# Altium footprint library tsl_Pcblib.PcbLib: 219 footprints (part 7 of 14)
Each footprint in its own frame and in the unit in brackets; x right, y up, seen from the top. Pads: shape width x height; smd on the part's side, far side on the other; paste and mask are expansions set on the pad; w line width, h text height; cw(c..) or ccw(c..) is an arc to the next point about the centre after c.
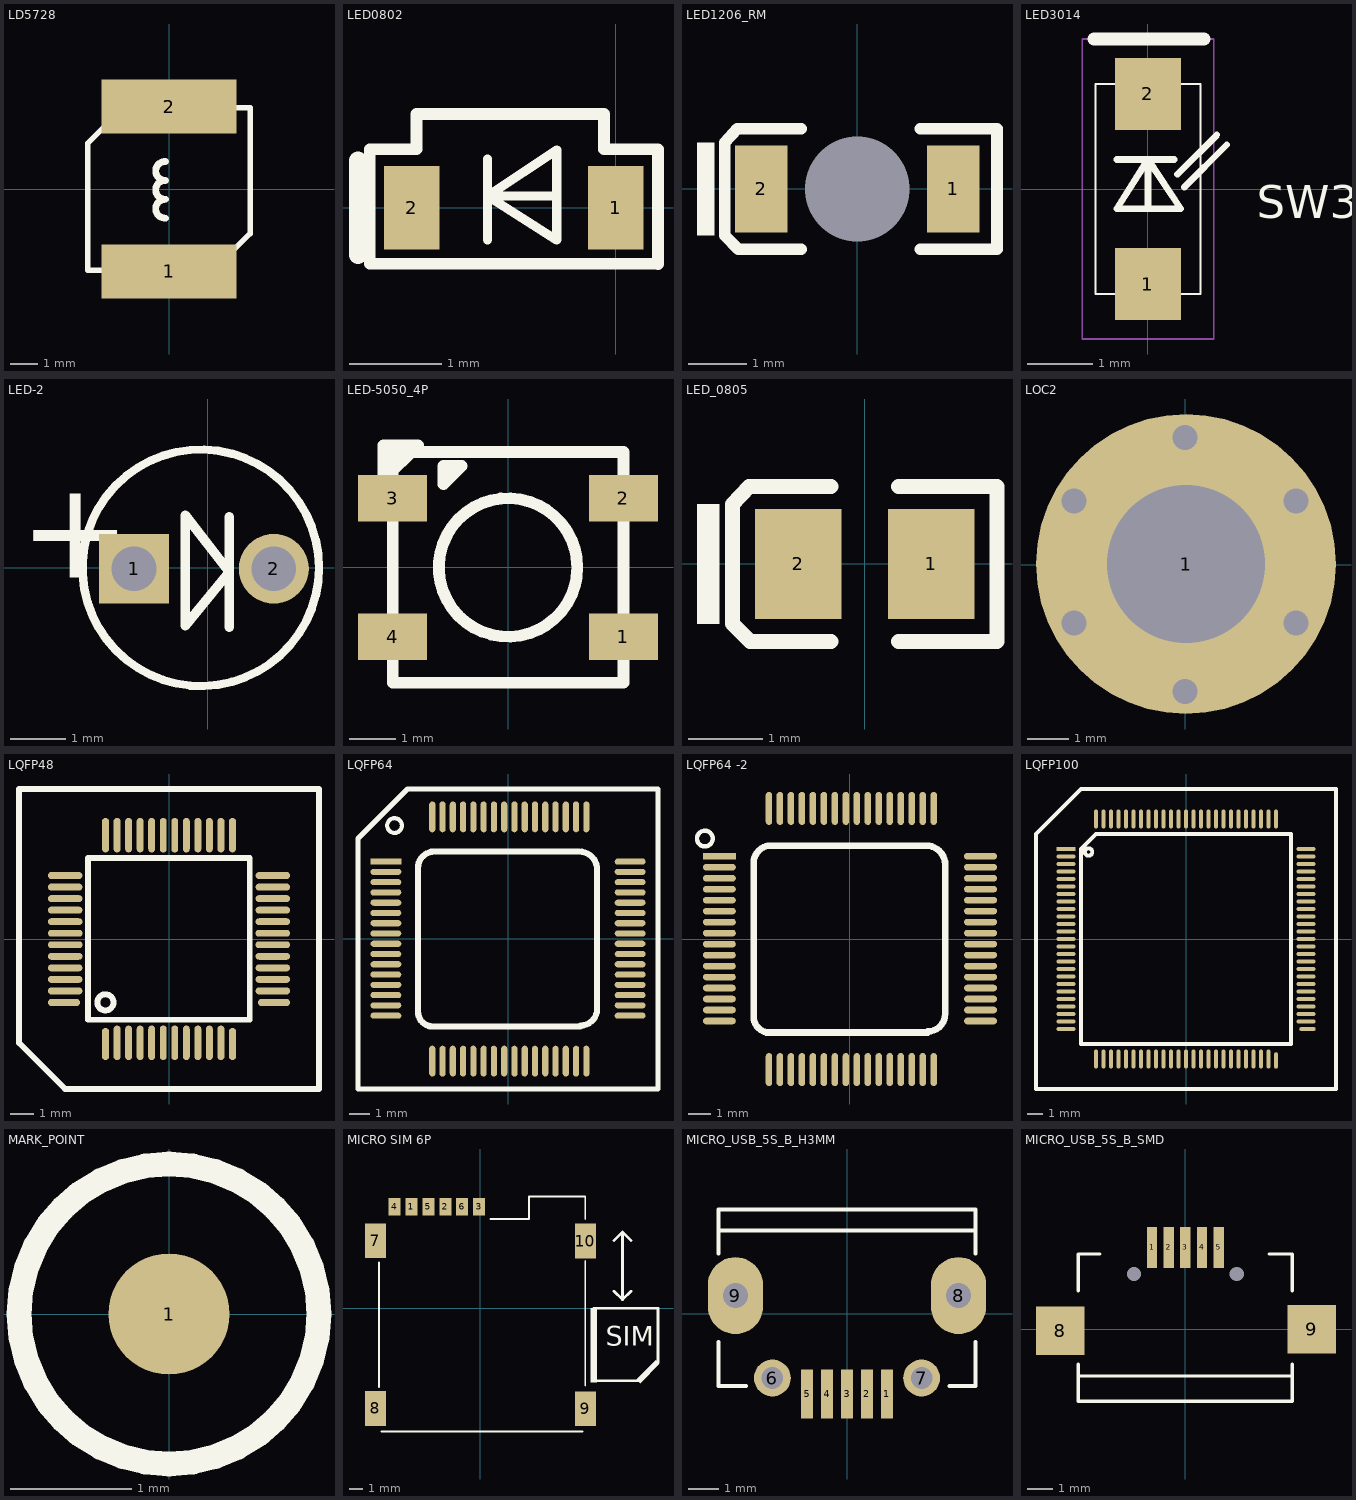
[diagram p6: the footprints below, top view; thin cyan lines are the x and y axes]

## LD5728 [mm]
pads (2):
  rect 5x2 smd: 1(0,-3.048) 2(0,3.048)
Top Overlay:
  lines w0.203: -3,-3 -3,0 -3,1.699 -1.699,3 0,3 3,3 3,0 3,-1.651 1.651,-3 0,-3 -3,-3
  lines w0.254: -0.127,-1.08 cw(c-0.142,-0.731) -0.127,-0.381 cw(c-0.142,-0.031) -0.127,0.318 cw(c-0.142,0.668) -0.127,1.018

## LED0802 [mm]
height 0.6
pads (2):
  rect 0.6x0.9 smd paste-0.05 mask+0.05: 1(0,0) 2(-2.21,0)
Top Overlay:
  lines w0.1: -1.391,-0.348 -1.391,0.527 ; -0.641,0.127 -1.391,0.127 ; -1.391,0.127 -0.641,0.627 -0.641,-0.348 -1.391,0.127
  lines w0.127: 0.457,-0.61 0.457,0.635 -0.127,0.635 -0.127,1.016 -2.159,1.016 -2.159,0.635 -2.667,0.635 -2.667,-0.608 0.457,-0.608
  lines w0.2: -2.794,-0.508 -2.794,0.508

## LED1206_RM [mm]
pads (3):
  rect 0.9x1.5 smd: 1(1.651,0) 2(-1.651,0)
  round 0 hole 1.8 unplated: ""(0,0)
Top Overlay:
  rectangle: -2.753,-0.8 -2.453,0.8
  lines w0.2: -0.958,-1.035 -2.043,-1.035 -2.278,-0.8 -2.278,0.8 -2.058,1.035 -0.958,1.035 ; 1.085,-1.035 2.405,-1.035 2.405,1.035 1.085,1.035

## LED3014 [mm]
pads (2):
  rect 1x1.1 smd paste-0.05 mask+0.05: 1(0,-1.45) 2(0,1.45)
Top Overlay:
  lines w0.025: -0.8,-1.6 -0.8,1.6 0.8,1.6 0.8,-1.6 -0.8,-1.6
  lines w0.1: -0.475,0.45 0.4,0.45 ; 0,-0.3 0,0.45 ; 0.45,0.225 1.05,0.825 ; 0.55,0.025 1.2,0.675 ; 0,0.45 -0.475,-0.3 0.5,-0.3 0,0.45
  lines w0.2: -0.825,2.286 0.85,2.286
  text "SW3" at 1.659,-0.445 h0.5
Mechanical 1:
  lines w0.025: -1,-2.286 1,-2.286 1,2.286 -1,2.286 -1,-2.286

## LED-2 [mil]
pads (2):
  rect 50x50 hole 32: 1(-52.72,-0.72)
  round 50 hole 32: 2(47.28,-0.72)
Top Overlay:
  circle w6: c-5,0 r84.61
  lines w7: 15.37,-42.37 15.37,36.37 ; -16,-41.37 -16,37.37 15.37,-3 -16,-41.37
  text "+" at -135,-30 h120

## LED-5050_4P [mm]
pads (4):
  rect 1.5x1 smd: 1(2.5,-1.5) 2(2.5,1.5) 3(-2.5,1.5) 4(-2.5,-1.5)
Top Overlay:
  circle w0.254: c0.001,0 r1.5
  lines w0.254: -2.699,1.9 -1.949,2.65 -2.699,2.65 -2.699,1.9 ; -2.499,-2.5 -2.499,2.5 2.501,2.5 2.501,-2.5 -2.499,-2.5 ; -1.399,1.8 -0.999,2.2 -1.399,2.2 -1.399,1.8

## LED_0805 [mm]
pads (2):
  rect 1.16x1.47 smd: 1(0.89,0) 2(-0.89,0)
Top Overlay:
  rectangle: -2.245,-0.8 -1.945,0.8
  lines w0.2: -0.45,-1.035 -1.535,-1.035 -1.77,-0.8 -1.77,0.8 -1.55,1.035 -0.45,1.035 ; 0.45,-1.035 1.77,-1.035 1.77,1.035 0.45,1.035
3D body "User Library-led_0805.step": height 1.1, standoff 0, extent -1.01,-0.625 1.01,0.625

## LOC2 [mm]
height 1.35
pads (1):
  round 7.2 hole 3.8: 1(0.021,0.014)
via 0,3.048 diameter 0.8 hole 0.6
via 2.667,-1.397 diameter 0.8 hole 0.6
via 2.667,1.524 diameter 0.8 hole 0.6
via -2.667,1.524 diameter 0.8 hole 0.6
via -2.667,-1.397 diameter 0.8 hole 0.6
via 0,-3.048 diameter 0.8 hole 0.6

## LQFP48 [mm]
pads (48):
  oval 0.3x1.4 smd: 1(-2.75,-4.55) 12(2.75,-4.55)
  oval 0.3x1.5 smd: 2(-2.25,-4.5) 3(-1.75,-4.5) 4(-1.25,-4.5) 5(-0.75,-4.5) 6(-0.25,-4.5) 7(0.25,-4.5) 8(0.75,-4.5) 9(1.25,-4.5) 10(1.75,-4.5) 11(2.25,-4.5) 25(2.75,4.5) 26(2.25,4.5) 27(1.75,4.5) 28(1.25,4.5) 29(0.75,4.5) 30(0.25,4.5) 31(-0.25,4.5) 32(-0.75,4.5) 33(-1.25,4.5) 34(-1.75,4.5) 35(-2.25,4.5) 36(-2.75,4.5)
  oval 1.4x0.3 smd: 13(4.55,-2.75) 48(-4.55,-2.75)
  oval 1.5x0.3 smd: 14(4.5,-2.25) 15(4.5,-1.75) 16(4.5,-1.25) 17(4.5,-0.75) 18(4.5,-0.25) 19(4.5,0.25) 20(4.5,0.75) 21(4.5,1.25) 22(4.5,1.75) 23(4.5,2.25) 24(4.5,2.75) 37(-4.5,2.75) 38(-4.5,2.25) 39(-4.5,1.75) 40(-4.5,1.25) 41(-4.5,0.75) 42(-4.5,0.25) 43(-4.5,-0.25) 44(-4.5,-0.75) 45(-4.5,-1.25) 46(-4.5,-1.75) 47(-4.5,-2.25)
Top Overlay:
  circle w0.254: c-2.753,-2.746 r0.35
  lines w0.254: -6.5,-4.5 -4.5,-6.5 6.5,-6.5 6.5,6.5 -6.5,6.5 -6.5,-4.5 ; -3.503,-3.496 -3.503,3.504 3.497,3.504 3.497,-3.496 -3.503,-3.496
3D body "User Library-LQFP48_Grid_0_5.STEP": height 1.6, standoff 0, extent -4.5,-4.5 4.5,4.5

## LQFP64 [mm] "LQFP64"
pads (64):
  rect 1.5x0.3 smd: 1(-5.945,3.768)
  oval 1.5x0.3 smd: 2(-5.945,3.268) 3(-5.945,2.768) 4(-5.945,2.268) 5(-5.945,1.768) 6(-5.945,1.268) 7(-5.945,0.768) 8(-5.945,0.268) 9(-5.945,-0.232) 10(-5.945,-0.732) 11(-5.945,-1.232) 12(-5.945,-1.732) 13(-5.945,-2.232) 14(-5.945,-2.732) 15(-5.945,-3.232) 16(-5.945,-3.732) 33(5.945,-3.732) 34(5.945,-3.232) 35(5.945,-2.732) 36(5.945,-2.232) 37(5.945,-1.732) 38(5.945,-1.232) 39(5.945,-0.732) 40(5.945,-0.232) 41(5.945,0.268) 42(5.945,0.768) 43(5.945,1.268) 44(5.945,1.768) 45(5.945,2.268) 46(5.945,2.768) 47(5.945,3.268) 48(5.945,3.768)
  oval 0.3x1.5 smd: 17(-3.687,-5.945) 18(-3.186,-5.945) 19(-2.687,-5.945) 20(-2.186,-5.945) 21(-1.687,-5.945) 22(-1.186,-5.945) 23(-0.687,-5.945) 24(-0.186,-5.945) 25(0.313,-5.945) 26(0.814,-5.945) 27(1.313,-5.945) 28(1.814,-5.945) 29(2.313,-5.945) 30(2.814,-5.945) 31(3.313,-5.945) 32(3.814,-5.945) 49(3.814,5.945) 50(3.313,5.945) 51(2.814,5.945) 52(2.313,5.945) 53(1.814,5.945) 54(1.313,5.945) 55(0.814,5.945) 56(0.313,5.945) 57(-0.186,5.945) 58(-0.687,5.945) 59(-1.186,5.945) 60(-1.687,5.945) 61(-2.186,5.945) 62(-2.687,5.945) 63(-3.186,5.945) 64(-3.687,5.945)
Top Overlay:
  circle w0.2: c-5.525,5.524 r0.358
  lines w0.254: -7.303,-7.303 7.302,-7.303 7.302,7.302 -4.89,7.302 -7.303,4.889 -7.303,-7.303
  lines w0.3: -3.811,-4.258 3.536,-4.258 ; -3.741,4.254 3.467,4.254 cw(c3.467,3.384) 4.337,3.384 ; -3.662,-4.258 cw(c-3.662,-3.538) -4.382,-3.538 -4.382,3.464 cw(c-3.592,3.464) -3.592,4.254 ; 3.536,-4.211 ccw(c3.536,-3.411) 4.337,-3.411 4.337,3.511
3D body "User Library-STM32F107 -LQFP64 10mm x 10mm.step": height 1.6, standoff 0.01, extent -5.999,-5.969 5.999,6.029

## LQFP64 -2 [mm] "LQFP64"
pads (64):
  rect 1.5x0.3 smd: 1(-5.945,3.768)
  oval 1.5x0.3 smd: 2(-5.945,3.268) 3(-5.945,2.768) 4(-5.945,2.268) 5(-5.945,1.768) 6(-5.945,1.268) 7(-5.945,0.768) 8(-5.945,0.268) 9(-5.945,-0.232) 10(-5.945,-0.732) 11(-5.945,-1.232) 12(-5.945,-1.732) 13(-5.945,-2.232) 14(-5.945,-2.732) 15(-5.945,-3.232) 16(-5.945,-3.732) 33(5.945,-3.732) 34(5.945,-3.232) 35(5.945,-2.732) 36(5.945,-2.232) 37(5.945,-1.732) 38(5.945,-1.232) 39(5.945,-0.732) 40(5.945,-0.232) 41(5.945,0.268) 42(5.945,0.768) 43(5.945,1.268) 44(5.945,1.768) 45(5.945,2.268) 46(5.945,2.768) 47(5.945,3.268) 48(5.945,3.768)
  oval 0.3x1.5 smd: 17(-3.687,-5.945) 18(-3.186,-5.945) 19(-2.687,-5.945) 20(-2.186,-5.945) 21(-1.687,-5.945) 22(-1.186,-5.945) 23(-0.687,-5.945) 24(-0.186,-5.945) 25(0.313,-5.945) 26(0.814,-5.945) 27(1.313,-5.945) 28(1.814,-5.945) 29(2.313,-5.945) 30(2.814,-5.945) 31(3.313,-5.945) 32(3.814,-5.945) 49(3.814,5.945) 50(3.313,5.945) 51(2.814,5.945) 52(2.313,5.945) 53(1.814,5.945) 54(1.313,5.945) 55(0.814,5.945) 56(0.313,5.945) 57(-0.186,5.945) 58(-0.687,5.945) 59(-1.186,5.945) 60(-1.687,5.945) 61(-2.186,5.945) 62(-2.687,5.945) 63(-3.186,5.945) 64(-3.687,5.945)
Top Overlay:
  circle w0.2: c-6.604,4.572 r0.358
  lines w0.3: -3.811,-4.258 3.536,-4.258 ; -3.741,4.254 3.467,4.254 cw(c3.467,3.384) 4.337,3.384 ; -3.662,-4.258 cw(c-3.662,-3.538) -4.382,-3.538 -4.382,3.464 cw(c-3.592,3.464) -3.592,4.254 ; 3.536,-4.211 ccw(c3.536,-3.411) 4.337,-3.411 4.337,3.511
3D body "User Library-STM32F107 -LQFP64 10mm x 10mm.step": height 1.6, standoff 0.01, extent -5.999,-5.969 5.999,6.029

## LQFP100 [mm]
pads (100):
  rect 1.25x0.25 smd: 1(-8,6)
  oval 1.25x0.25 smd: 2(-8,5.5) 3(-8,5) 4(-8,4.5) 5(-8,4) 6(-8,3.5) 7(-8,3) 8(-8,2.5) 9(-8,2) 10(-8,1.5) 11(-8,1) 12(-8,0.5) 13(-8,0) 14(-8,-0.5) 15(-8,-1) 16(-8,-1.5) 17(-8,-2) 18(-8,-2.5) 19(-8,-3) 20(-8,-3.5) 21(-8,-4) 22(-8,-4.5) 23(-8,-5) 24(-8,-5.5) 25(-8,-6) 52(8,-5.5) 53(8,-5) 54(8,-4.5) 55(8,-4) 56(8,-3.5) 57(8,-3) 58(8,-2.5) 59(8,-2) 60(8,-1.5) 61(8,-1) 62(8,-0.5) 63(8,0) 64(8,0.5) 65(8,1) 66(8,1.5) 67(8,2) 68(8,2.5) 69(8,3) 70(8,3.5) 71(8,4) 72(8,4.5) 73(8,5) 74(8,5.5) 75(8,6)
  oval 0.25x1.25 smd: 26(-6,-8) 27(-5.5,-8) 28(-5,-8) 29(-4.5,-8) 30(-4,-8) 31(-3.5,-8) 32(-3,-8) 33(-2.5,-8) 34(-2,-8) 35(-1.5,-8) 36(-1,-8) 37(-0.5,-8) 38(0,-8) 39(0.5,-8) 40(1,-8) 41(1.5,-8) 42(2,-8) 43(2.5,-8) 44(3,-8) 45(3.5,-8) 46(4,-8) 47(4.5,-8) 48(5,-8) 49(5.5,-8) 76(6,8) 77(5.5,8) 78(5,8) 79(4.5,8) 80(4,8) 81(3.5,8) 82(3,8) 83(2.5,8) 84(2,8) 85(1.5,8) 86(1,8) 87(0.5,8) 88(0,8) 89(-0.5,8) 90(-1,8) 91(-1.5,8) 92(-2,8) 93(-2.5,8) 94(-3,8) 95(-3.5,8) 96(-4,8) 97(-4.5,8) 98(-5,8) 99(-5.5,8) 100(-6,8)
  oval 0.25x1.1 smd: 50(6,-8.1)
  oval 1.1x0.25 smd: 51(8.1,-6)
Top Overlay:
  circle w0.254: c-6.5,5.8 r0.25
  lines w0.254: -10,-10 10,-10 10,10 -7,10 -10,7 -10,-10 ; -7,-7 7,-7 7,7 -6,7 -7,6 -7,-7
3D body "User Library-LQFP100-3.STEP": height 1.62, standoff -0.01, extent -8.071,-8.071 8.072,8.072

## MARK_POINT [mm]
pads (1):
  round 1 smd mask+0.5: 1(0,0)
Top Overlay:
  circle w0.203: c0,0 r1.235

## MICRO SIM 6P [mm] "自弹MICROSIM卡座 SIM-002-6P"
pads (10):
  rect 0.9x1.34 smd: 1(-5.177,7.62) 2(-2.637,7.62) 3(-0.097,7.62) 4(-6.447,7.62) 5(-3.907,7.62) 6(-1.367,7.62)
  rect 1.56x2.61 smd: 7(-7.887,5.067) 8(-7.887,-7.531) 9(7.887,-7.556) 10(7.887,5.042)
Top Overlay:
  region: 13.462,-4.191 13.166,-3.895 11.691,-5.37 11.987,-5.666
  rectangle: 8.255,-5.588 8.763,0
  lines w0.127: -7.62,-5.944 -7.62,3.429 ; -7.455,-9.258 7.683,-9.258 ; 0.749,6.693 3.645,6.693 3.645,8.382 7.874,8.382 7.874,6.668 ; 7.874,-5.817 7.874,3.556
  lines w0.2: 8.509,-5.461 11.938,-5.461 ; 8.509,0 13.335,0 13.335,-4.064 ; 10.033,1.27 10.668,0.635 ; 10.033,5.08 10.668,5.715 ; 11.303,1.27 10.668,0.635 ; 11.303,5.08 10.668,5.715 ; 10.668,0.635 10.668,5.715
  text "SIM" at 9.398,-3.302 h2.54
3D body "User Library-Sim Holder.step": height 1.35, standoff 0, extent -8.255,-9.235 8.145,7.965

## MICRO_USB_5S_B_H3MM [mm] "MICRO_USB_5S_B_H3MM"
pads (9):
  rect 0.4x1.6 smd: 1(1.3,-2.607) 2(0.65,-2.607) 3(0,-2.607) 4(-0.65,-2.607) 5(-1.3,-2.607)
  round 1.2 / inner round 1.524 / far side round 1.2 hole 0.7: 6(-2.425,-2.087) 7(2.425,-2.087)
  oval 1.8x2.5 / inner round 1.524 / far side oval 1.8x2.5 hole 0.8: 8(3.625,0.593) 9(-3.625,0.593)
Top Overlay:
  lines w0.127: -4.175,-0.912 -4.175,-2.347 -3.277,-2.347 ; -4.175,1.958 -4.175,3.393 4.175,3.393 4.175,1.958 ; -4.175,2.713 4.175,2.713 ; 3.327,-2.347 4.175,-2.347 4.175,-0.912

## MICRO_USB_5S_B_SMD [mm] "MICRO_USB_5S_B_SMD"
pads (9):
  rect 0.4x1.6 smd: 1(-1.3,3.2) 2(-0.65,3.2) 3(0,3.2) 4(0.65,3.2) 5(1.3,3.2)
  round 0 hole 0.55 unplated: 6(2.007,2.159) 7(-2.007,2.159)
  rect 1.9x1.9 smd: 8(-4.877,-0.051) 9(4.928,0)
Top Overlay:
  lines w0.127: -4.175,-1.815 4.175,-1.815 ; -4.175,-1.365 -4.175,-2.8 4.175,-2.8 4.175,-1.365 ; -4.175,1.505 -4.175,2.94 -3.327,2.94 ; 3.277,2.94 4.175,2.94 4.175,1.505